# Altium footprint library RPSLib.PcbLib: 116 footprints (part 8 of 8)
Each footprint in its own frame and in the unit in brackets; x right, y up, seen from the top. Pads: shape width x height; smd on the part's side, far side on the other; paste and mask are expansions set on the pad; w line width, h text height; cw(c..) or ccw(c..) is an arc to the next point about the centre after c.
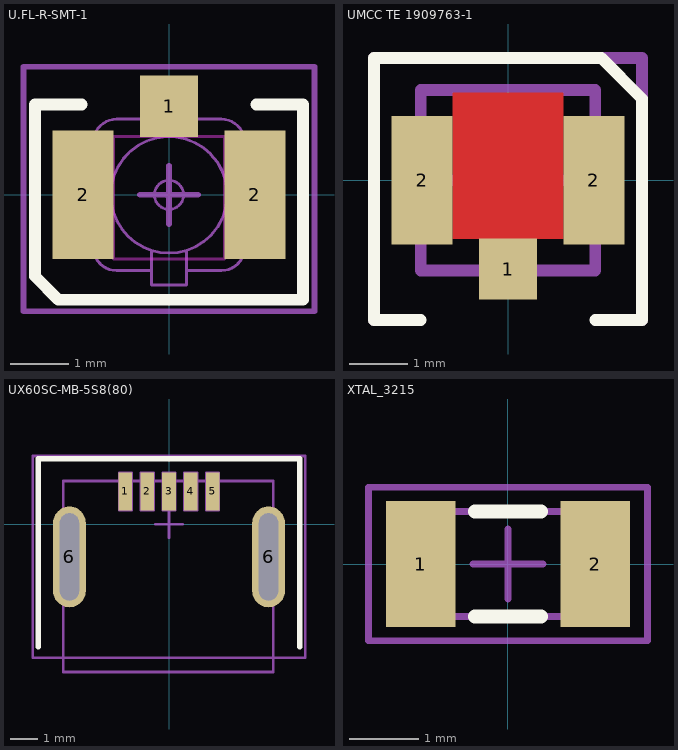
[diagram p7: the footprints below, top view; thin cyan lines are the x and y axes]

## U.FL-R-SMT-1 [mm] "U.FL SMD connector"
height 1.25
pads (3):
  rect 1x1.05 smd mask+0.07: 1(0,1.52)
  rect 1.05x2.2 smd mask+0.07: 2(-1.475,0) 2(1.475,0)
Top Layer keep-out:
  lines w0.05: -0.95,-1.1 0.95,-1.1 0.95,1 -0.95,1 -0.95,-1.1
Top Overlay:
  lines w0.2: -1.5,1.55 -2.3,1.55 -2.3,-1.4 -1.9,-1.8 2.3,-1.8 2.3,1.55 1.5,1.55
Mechanical 3:
  lines w0.1: -2.5,-2 -2.5,2.2 2.5,2.2 2.5,-2 -2.5,-2
Mechanical 13:
  circle w0.05: c0,0 r0.05
  lines w0.05: -0.3,-1.3 -0.9,-1.3 cw(c-0.9,-0.9) -1.3,-0.9 ; -0.3,1.3 -0.3,1.55 0.3,1.55 0.3,1.3 ; 0.3,-1.3 0.9,-1.3 ccw(c0.9,-0.9) 1.3,-0.9 ; -1.3,-0.9 -1.3,0.9 ; -1.3,-0.9 -1.5,-0.9 -1.5,0.9 -1.3,0.9 ; -1.3,0.9 cw(c-0.9,0.9) -0.9,1.3 0.9,1.3 cw(c0.9,0.9) 1.3,0.9 ; -0.3,-0.954 ccw(c0,0) 0.3,-0.954 ; -0.3,-0.954 cw(c0,0) -1,0 cw(c0,0) 0.3,-0.954 ; -0.3,-0.954 -0.3,-1.55 0.3,-1.55 0.3,-0.954 ; 1.3,-0.9 1.3,0.9 ; 1.3,-0.9 1.5,-0.9 1.5,0.9 1.3,0.9 ; -0.25,0 cw(c0,0) 0.25,0 cw(c0,0) -0.25,0
Mechanical 15:
  lines w0.1: -0.5,0 0.5,0 ; 0,-0.5 0,0.5
3D body "U.FL-R-SMT-1.stp": height 1.25, standoff 0, extent -1.5,-1.55 1.5,1.55

## UMCC TE 1909763-1 [mm]
height 1.25
pads (3):
  rect 1x1.05 smd mask+0.07: 1(0,-1.525)
  rect 1.05x2.2 smd mask+0.07: 2(-1.475,0) 2(1.475,0)
Top Layer:
  pour cut-out: -0.95,-1 -0.95,1.5 0.95,1.5 0.95,-1
Top Overlay:
  lines w0.2: -1.5,-2.4 -2.3,-2.4 -2.3,2.1 1.6,2.1 2.3,1.4 2.3,-2.4 1.5,-2.4
Mechanical 13:
  lines w0.2: -1.5,-1.55 -1.5,1.55 1.5,1.55 1.5,-1.55 -1.5,-1.55
Mechanical 15:
  lines w0.2: -2.3,-2.4 -2.3,2.1 2.3,2.1 2.3,-2.4 ; -1,0 1,0 ; 0,-1 0,1
3D body "С-1909763-1.stp": height 1.23, standoff 0, extent -1.5,-1.55 1.5,1.55

## UX60SC-MB-5S8(80) [mm]
height 4
pads (7):
  rect 0.5x1.4 smd mask+0.07: 1(-1.6,1.2) 2(-0.8,1.2) 3(0,1.2) 4(0.8,1.2) 5(1.6,1.2)
  oval 1.2x3.7 hole 0.7 slot 3.2 at 90 deg mask+0.07: 6(-3.65,-1.2) 6(3.65,-1.2)
Top Overlay:
  lines w0.2: -4.8,-4.5 -4.8,2.4 4.8,2.4 4.8,-4.5
Mechanical 1:
  lines w0.05: -3.897,-2.697 -3.403,0.297 ; -3.897,0.297 -3.403,-2.697 ; 3.403,-2.697 3.897,0.297 ; 3.403,0.297 3.897,-2.697 ; -1.85,0.5 -1.35,1.9 ; -1.85,0.5 -1.85,1.9 ; -1.85,0.5 -1.35,0.5 ; -1.85,1.9 -1.35,0.5 ; -1.85,1.9 -1.35,1.9 ; -1.35,0.5 -1.35,1.9 ; -1.05,0.5 -0.55,1.9 ; -1.05,0.5 -1.05,1.9 ; -1.05,0.5 -0.55,0.5 ; -1.05,1.9 -0.55,0.5 ; -1.05,1.9 -0.55,1.9 ; -0.55,0.5 -0.55,1.9 ; -0.25,0.5 0.25,1.9 ; -0.25,0.5 -0.25,1.9 ; -0.25,0.5 0.25,0.5 ; -0.25,1.9 0.25,0.5 ; -0.25,1.9 0.25,1.9 ; 0.25,0.5 0.25,1.9 ; 0.55,0.5 1.05,1.9 ; 0.55,0.5 0.55,1.9 ; 0.55,0.5 1.05,0.5 ; 0.55,1.9 1.05,0.5 ; 0.55,1.9 1.05,1.9 ; 1.05,0.5 1.05,1.9 ; 1.35,0.5 1.85,1.9 ; 1.35,0.5 1.35,1.9 ; 1.35,0.5 1.85,0.5 ; 1.35,1.9 1.85,0.5 ; 1.35,1.9 1.85,1.9 ; 1.85,0.5 1.85,1.9 ; -4,-2.45 ccw(c-3.65,-2.45) -3.65,-2.8 ccw(c-3.65,-2.45) -3.3,-2.45 -3.3,0.05 ccw(c-3.65,0.05) -3.65,0.4 ccw(c-3.65,0.05) -4,0.05 -4,-2.45 ; 3.3,-2.45 ccw(c3.65,-2.45) 3.65,-2.8 ccw(c3.65,-2.45) 4,-2.45 4,0.05 ccw(c3.65,0.05) 3.65,0.4 ccw(c3.65,0.05) 3.3,0.05 3.3,-2.45
Mechanical 13:
  lines w0.1: -3.875,-5.421 -3.875,1.579 3.825,1.579 3.825,-5.421 -3.875,-5.421
Mechanical 15:
  lines w0.1: -0.5,0 0.5,0 ; 0,-0.5 0,0.5 ; -5,-4.9 -5,2.5 5,2.5 5,-4.9 -5,-4.9
3D body "UX60SC-MB-5S8.stp": height 3.9, standoff -0.8, extent -3.875,-5.421 3.825,1.579

## XTAL_3215 [mm]
pads (2):
  rect 1x1.8 smd: 1(-1.25,0) 2(1.25,0)
Top Overlay:
  lines w0.2: -0.475,-0.75 0.475,-0.75 ; -0.475,0.75 0.475,0.75
Mechanical 3:
  lines w0.1: -1.6,-0.55 cw(c-1.6,-0.75) -1.4,-0.75 1.4,-0.75 cw(c1.6,-0.75) 1.6,-0.55 1.6,0.55 cw(c1.6,0.75) 1.4,0.75 -1.4,0.75 cw(c-1.6,0.75) -1.6,0.55 -1.6,-0.55
Mechanical 15:
  lines w0.1: -0.5,0 0.5,0 ; 0,-0.5 0,0.5 ; -2,-1.1 2,-1.1 2,1.1 -2,1.1 -2,-1.1
3D body "User Library-Siward_SX3215.step": height 0.81, standoff 0, extent -1.6,-0.75 1.6,0.75
3D body: height 0.81, standoff 0.15, extent -1.2,-0.6 1.2,0.6